# Altium footprint library Capacitance.PcbLib: 176 footprints (part 7 of 11)
Each footprint in its own frame and in the unit in brackets; x right, y up, seen from the top. Pads: shape width x height; smd on the part's side, far side on the other; paste and mask are expansions set on the pad; w line width, h text height; cw(c..) or ccw(c..) is an arc to the next point about the centre after c.
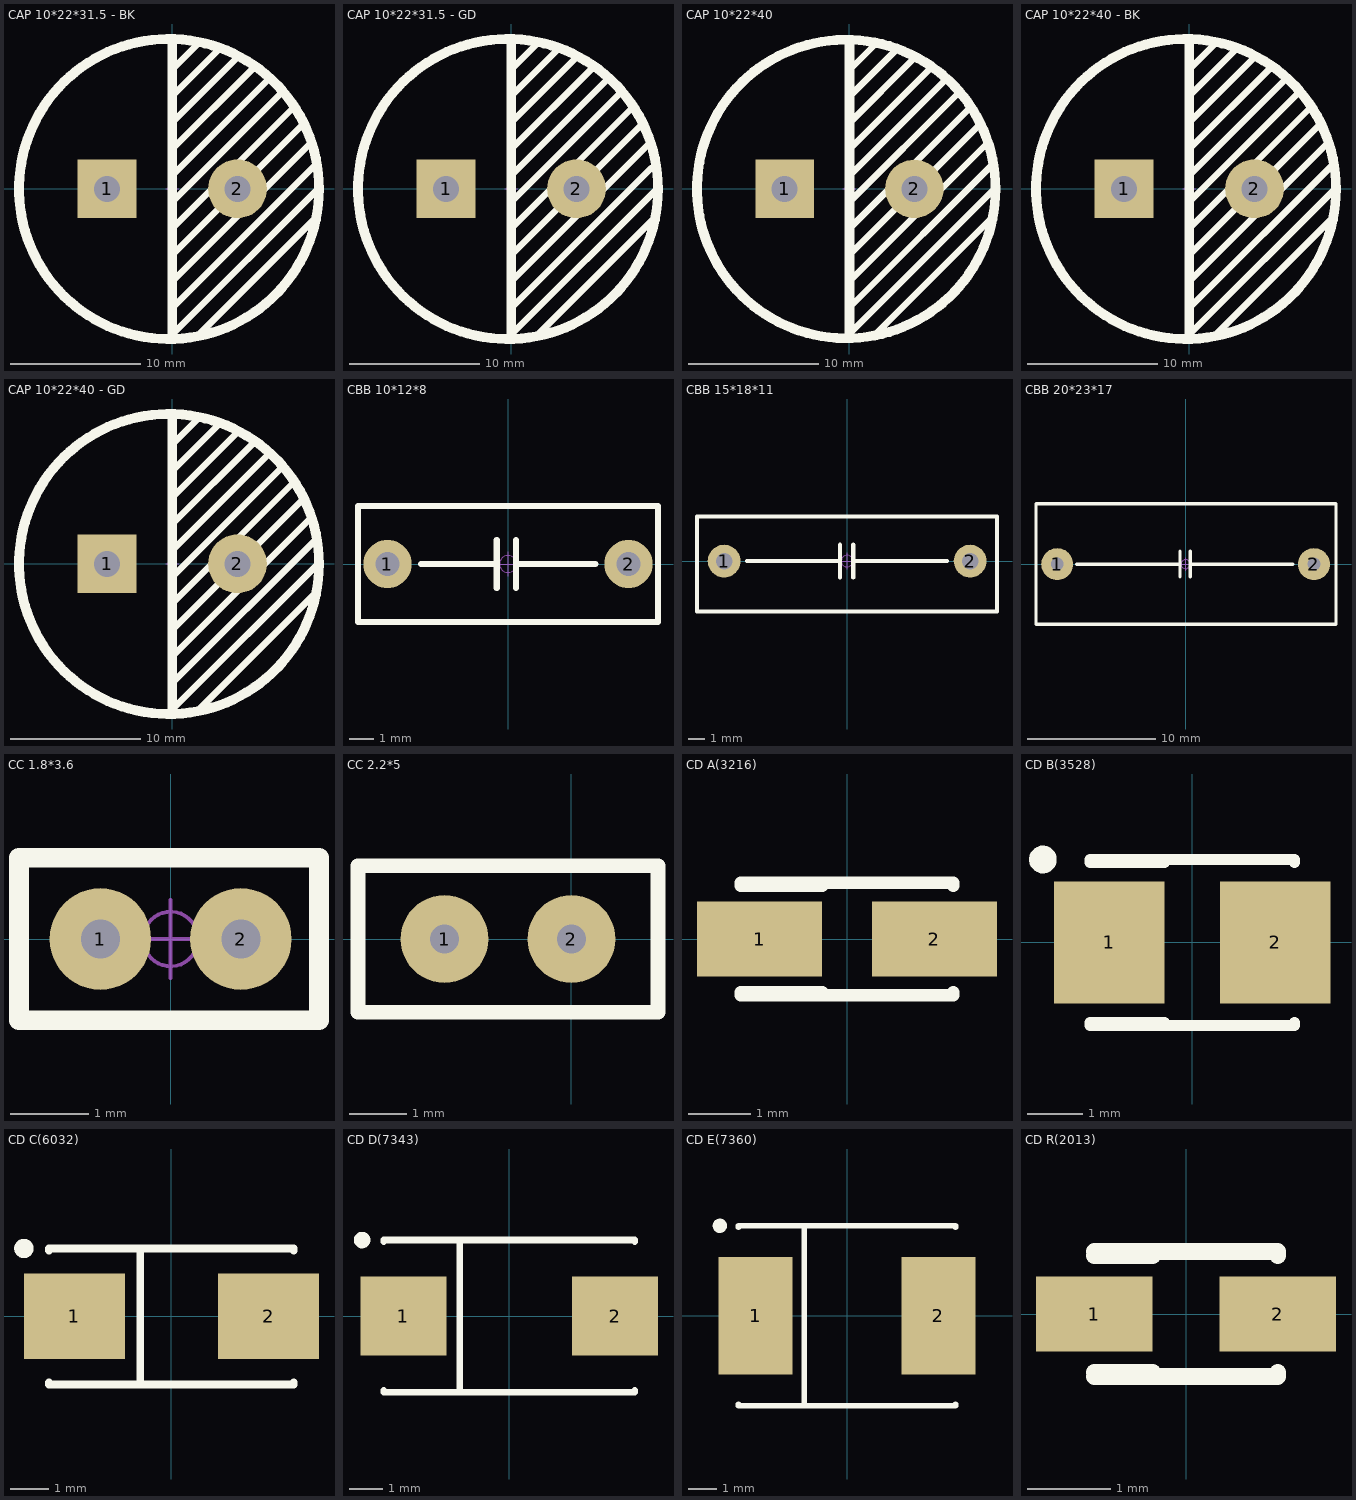
[diagram p6: the footprints below, top view; thin cyan lines are the x and y axes]

## CAP 10*22*31.5 - BK [mm] "ï¿½Å¾ï¿½10mmÖ±ï¿½ï¿½22mmï¿½ß¶ï¿½31.5mm"
pads (2):
  rect 4.5x4.5 hole 2: 1(-5,0)
  round 4.5 hole 2: 2(5,0)
Top Overlay:
  circle w0.754: c-0.248,-0.013 r11.5
  lines w0.504: 0,-7.112 10.541,3.429 ; 0,-5.08 10.033,4.953 ; 0,-3.048 9.271,6.223 ; 0,-1.016 8.382,7.366 ; 0,1.016 7.493,8.509 ; 0,3.048 6.223,9.271 ; 0,5.08 4.953,10.033 ; 0,7.112 3.556,10.668 ; 0.254,-10.922 11.208,0.032 ; 0.254,-8.89 10.986,1.841 ; 0.254,9.398 2.032,11.176 ; 1.778,-11.43 11.049,-2.159
  lines w0.754: 0,-11.25 0,11.25
Mechanical 15:
  circle w0.05: c0,0 r0.35
  lines w0.05: -0.5,0 0.5,0 ; 0,-0.5 0,0.5
3D body "CAP 10X22X31.5.STEP": height 31.54, standoff -3.37, extent -11,-10.997 11.01,10.997

## CAP 10*22*31.5 - GD [mm] "ï¿½Å¾ï¿½10mmÖ±ï¿½ï¿½22mmï¿½ß¶ï¿½31.5mm"
pads (2):
  rect 4.5x4.5 hole 2: 1(-5,0)
  round 4.5 hole 2: 2(5,0)
Top Overlay:
  circle w0.754: c-0.248,-0.013 r11.5
  lines w0.504: 0,-7.112 10.541,3.429 ; 0,-5.08 10.033,4.953 ; 0,-3.048 9.271,6.223 ; 0,-1.016 8.382,7.366 ; 0,1.016 7.493,8.509 ; 0,3.048 6.223,9.271 ; 0,5.08 4.953,10.033 ; 0,7.112 3.556,10.668 ; 0.254,-10.922 11.208,0.032 ; 0.254,-8.89 10.731,1.587 ; 0.254,9.398 2.032,11.176 ; 1.778,-11.43 11.049,-2.159
  lines w0.754: 0,-11.25 0,11.25
Mechanical 15:
  circle w0.05: c0,0 r0.35
  lines w0.05: -0.5,0 0.5,0 ; 0,-0.5 0,0.5
3D body "CAP 10X22X31.5.STEP": height 31.54, standoff -3.37, extent -11,-10.997 11.01,10.997

## CAP 10*22*40 [mm] "ï¿½Å¾ï¿½10mmÖ±ï¿½ï¿½22mmï¿½ß¶ï¿½40mm"
pads (2):
  rect 4.5x4.5 hole 2: 1(-5,0)
  round 4.5 hole 2: 2(5,0)
Top Overlay:
  circle w0.754: c-0.248,-0.013 r11.5
  lines w0.504: 0,-7.112 10.541,3.429 ; 0,-5.08 10.033,4.953 ; 0,-3.048 9.271,6.223 ; 0,-1.016 8.382,7.366 ; 0,1.016 7.493,8.509 ; 0,3.048 6.223,9.271 ; 0,5.08 4.953,10.033 ; 0,7.112 3.556,10.668 ; 0.254,-10.922 11.367,0.191 ; 0.254,-8.89 10.986,1.841 ; 0.254,9.398 2.032,11.176 ; 1.778,-11.43 11.049,-2.159
  lines w0.754: 0,-11.25 0,11.25
Mechanical 15:
  circle w0.05: c0,0 r0.35
  lines w0.05: -0.5,0 0.5,0 ; 0,-0.5 0,0.5
3D body "CAP 10X22X40.STEP": height 40.03, standoff -3.38, extent -11,-10.999 11.01,10.999

## CAP 10*22*40 - BK [mm] "ï¿½Å¾ï¿½10mmÖ±ï¿½ï¿½22mmï¿½ß¶ï¿½40mm"
pads (2):
  rect 4.5x4.5 hole 2: 1(-5,0)
  round 4.5 hole 2: 2(5,0)
Top Overlay:
  circle w0.754: c-0.248,-0.013 r11.5
  lines w0.504: 0,-7.112 10.541,3.429 ; 0,-5.08 10.033,4.953 ; 0,-3.048 9.271,6.223 ; 0,-1.016 8.382,7.366 ; 0,1.016 7.493,8.509 ; 0,3.048 6.223,9.271 ; 0,5.08 4.953,10.033 ; 0,7.112 3.556,10.668 ; 0.254,-10.922 11.208,0.032 ; 0.254,-8.89 11.049,1.905 ; 0.254,9.398 2.032,11.176 ; 1.778,-11.43 11.049,-2.159
  lines w0.754: 0,-11.25 0,11.25
Mechanical 15:
  circle w0.05: c0,0 r0.35
  lines w0.05: -0.5,0 0.5,0 ; 0,-0.5 0,0.5
3D body "CAP 10X22X40.STEP": height 40.04, standoff -3.37, extent -11,-10.999 11.01,10.999

## CAP 10*22*40 - GD [mm] "ï¿½Å¾ï¿½10mmÖ±ï¿½ï¿½22mmï¿½ß¶ï¿½40mm"
pads (2):
  rect 4.5x4.5 hole 2: 1(-5,0)
  round 4.5 hole 2: 2(5,0)
Top Overlay:
  circle w0.754: c-0.248,-0.013 r11.5
  lines w0.504: 0,-7.112 10.541,3.429 ; 0,-5.08 10.033,4.953 ; 0,-3.048 9.271,6.223 ; 0,-1.016 8.382,7.366 ; 0,1.016 7.493,8.509 ; 0,3.048 6.223,9.271 ; 0,5.08 4.953,10.033 ; 0,7.112 3.556,10.668 ; 0.254,-10.922 11.208,0.032 ; 0.254,-8.89 11.049,1.905 ; 0.254,9.398 2.032,11.176 ; 1.778,-11.43 11.049,-2.159
  lines w0.754: 0,-11.25 0,11.25
Mechanical 15:
  circle w0.05: c0,0 r0.35
  lines w0.05: -0.5,0 0.5,0 ; 0,-0.5 0,0.5
3D body "CAP 10X22X40.STEP": height 40.04, standoff -3.37, extent -11,-10.999 11.01,10.999

## CBB 10*12*8 [mm] "ï¿½Å¾ï¿½10mmï¿½ï¿½12mmï¿½ï¿½8mm"
pads (2):
  round 2 hole 1: 1(-5,0) 2(5,0)
Top Overlay:
  lines w0.254: -3.603,0 -0.555,0 ; -0.466,-1 -0.466,1 ; 0.334,-1 0.334,1 ; 0.461,0 3.636,0 ; -6.223,-2.413 6.223,-2.413 6.223,2.413 -6.223,2.413 -6.223,-2.413
Mechanical 15:
  circle w0.05: c0,0 r0.35
  lines w0.05: -0.5,0 0.5,0 ; 0,-0.5 0,0.5
3D body "CBB 10X12X8.STEP": height 8.53, standoff -3.47, extent -6,-2.25 6,2.25

## CBB 15*18*11 [mm] "ï¿½Å¾ï¿½15mmï¿½ï¿½18mmï¿½ï¿½11mm"
pads (2):
  round 2 hole 1: 1(-7.5,0) 2(7.5,0)
Top Overlay:
  lines w0.254: -6.103,0 -0.515,0 ; -0.426,-1 -0.426,1 ; 0.374,-1 0.374,1 ; 0.501,0 6.089,0 ; -9.151,-3.073 -9.151,2.718 9.137,2.718 9.137,-3.073 -9.151,-3.073
Mechanical 15:
  circle w0.05: c0,0 r0.35
  lines w0.05: -0.5,0 0.5,0 ; 0,-0.5 0,0.5
3D body "CBB 15X18X11.STEP": height 11.53, standoff -3.47, extent -9.007,-2.921 8.993,2.579

## CBB 20*23*17 [mm] "ï¿½Å¾ï¿½20mmï¿½ï¿½23mmï¿½ï¿½17mm"
pads (2):
  round 2.5 hole 1: 1(-10,0) 2(10,0)
Top Overlay:
  lines w0.254: -8.476,0 -0.515,0 ; -0.426,-1 -0.426,1 ; 0.374,-1 0.374,1 ; 0.414,0 8.375,0 ; -11.651,-4.674 11.717,-4.674 11.717,4.699 -11.651,4.699 -11.651,-4.674
Mechanical 15:
  circle w0.05: c0,0 r0.35
  lines w0.05: -0.5,0 0.5,0 ; 0,-0.5 0,0.5
3D body "CBB 20X23X17.STEP": height 17.53, standoff -3.47, extent -11.5,-4.5 11.5,4.5

## CC 1.8*3.6 [mm] "ï¿½Å¾ï¿½1.8mmÖ±ï¿½ï¿½3.6mm"
pads (2):
  round 1.3 hole 0.5: 1(-0.9,0) 2(0.9,0)
Top Overlay:
  lines w0.254: -1.941,-1.041 1.9,-1.041 1.9,1.041 -1.941,1.041 -1.941,-1.041
Mechanical 15:
  circle w0.05: c0,0 r0.35
  lines w0.05: -0.5,0 0.5,0 ; 0,-0.5 0,0.5
3D body "CC 1.8X3.6.STEP": height 3.6, standoff -3.5, extent -1.8,-0.798 1.8,0.796

## CC 2.2*5 [mil] "ï¿½Å¾ï¿½2.2mmÖ±ï¿½ï¿½5mm"
height 250
pads (2):
  round 60 hole 19.68: 1(-86.61,0) 2(0,0)
Top Overlay:
  lines w10: -145.67,-49.98 -145.67,50.02 59.06,50.02 59.06,-49.98 -145.67,-49.98
3D body "CC 2.2X5.STEP": height 188.98, standoff -137.86, extent -137.79,-36.11 51.18,36.14

## CD A(3216) [mm] "Capacitor, SM Tantalum; Body 3.2 x 1.6 mm (LxW typ)"
height 1.8
pads (2):
  rect 2x1.2 smd: 1(-1.4,0) 2(1.4,0)
Top Overlay:
  lines w0.2: -1.7,-0.9 1.7,-0.9 1.7,-0.85 ; -1.7,-0.85 -0.4,-0.85 ; -1.7,0.85 -0.4,0.85 ; -1.7,0.9 1.7,0.9 1.7,0.85
3D body "User Library-CaseA_3216-18.SLDPRT": height 1.6, standoff 0, extent -1.6,-0.8 1.6,0.8

## CD B(3528) [mm] "Capacitor, SM Tantalum; Body 3.5 x 2.8 mm (LxW typ)"
height 2.1
pads (2):
  rect 2x2.2 smd: 1(-1.5,0) 2(1.5,0)
Top Overlay:
  circle w0.25: c-2.7,1.5 r0.125
  lines w0.2: -1.85,-1.5 1.85,-1.5 1.85,-1.45 ; -1.85,-1.45 -0.5,-1.45 ; -1.85,1.45 -0.5,1.45 ; -1.85,1.5 1.85,1.5 1.85,1.45
3D body "User Library-CaseB_3528-21.SLDPRT": height 1.9, standoff 0, extent -1.75,-1.4 1.75,1.4

## CD C(6032) [mm] "Capacitor, SM Tantalum; Body 6.0 x 3.2 mm (LxW typ)"
height 2.8
pads (2):
  rect 2.6x2.2 smd: 1(-2.5,0) 2(2.5,0)
Top Overlay:
  circle w0.25: c-3.8,1.75 r0.125
  lines w0.2: -3.15,-1.7 -3.15,-1.75 3.15,-1.75 3.15,-1.7 ; -3.15,1.7 -3.15,1.75 3.15,1.75 3.15,1.7 ; -0.8,-1.75 -0.8,1.75
3D body "User Library-CaseC_6032-28.SLDPRT": height 2.5, standoff 0, extent -3,-1.6 3,1.6

## CD D(7343) [mm] "Capacitor, SM Tantalum; Body 7.3 x 4.3 mm (LxW typ)"
height 3.1
pads (2):
  rect 2.6x2.4 smd: 1(-3.2,0) 2(3.2,0)
Top Overlay:
  circle w0.25: c-4.45,2.3 r0.125
  lines w0.2: -3.8,-2.25 -3.8,-2.3 3.8,-2.3 3.8,-2.25 ; -3.8,2.25 -3.8,2.3 3.8,2.3 3.8,2.25 ; -1.5,-2.3 -1.5,2.3
3D body "User Library-CaseD_7343-31.SLDPRT": height 2.8, standoff 0, extent -3.65,-2.15 3.65,2.15

## CD E(7360) [mm] "Capacitor, SM Tantalum; Body 7.3 x 6.0 mm (LxW typ)"
height 3.8
pads (2):
  rect 2.6x4.1 smd: 1(-3.2,0) 2(3.2,0)
Top Overlay:
  circle w0.25: c-4.45,3.15 r0.125
  lines w0.2: -3.8,-3.1 -3.8,-3.15 3.8,-3.15 3.8,-3.1 ; -3.8,3.1 -3.8,3.15 3.8,3.15 3.8,3.1 ; -1.5,-3.15 -1.5,3.15
3D body "User Library-CaseE_7260-38.SLDPRT": height 3.6, standoff 0, extent -3.65,-3 3.65,3

## CD R(2013) [mm] "Capacitor, SM Tantalum; Body 2.0 x 1.3 mm (LxW typ)"
height 1.2
pads (2):
  rect 1.4x0.9 smd: 1(-1.1,0) 2(1.1,0)
Top Overlay:
  lines w0.2: -1.1,-0.75 1.1,-0.75 1.1,-0.7 ; -1.1,-0.7 -0.4,-0.7 ; -1.1,0.7 -0.4,0.7 ; -1.1,0.75 1.1,0.75 1.1,0.7
3D body "User Library-CaseR_2012-12.SLDPRT": height 1.2, standoff 0, extent -1,-0.65 1,0.65